# Altium footprint library 7SEG.PCBLIB: 23 footprints (part 2 of 2)
Each footprint in its own frame and in the unit in brackets; x right, y up, seen from the top. Pads: shape width x height; smd on the part's side, far side on the other; paste and mask are expansions set on the pad; w line width, h text height; cw(c..) or ccw(c..) is an arc to the next point about the centre after c.
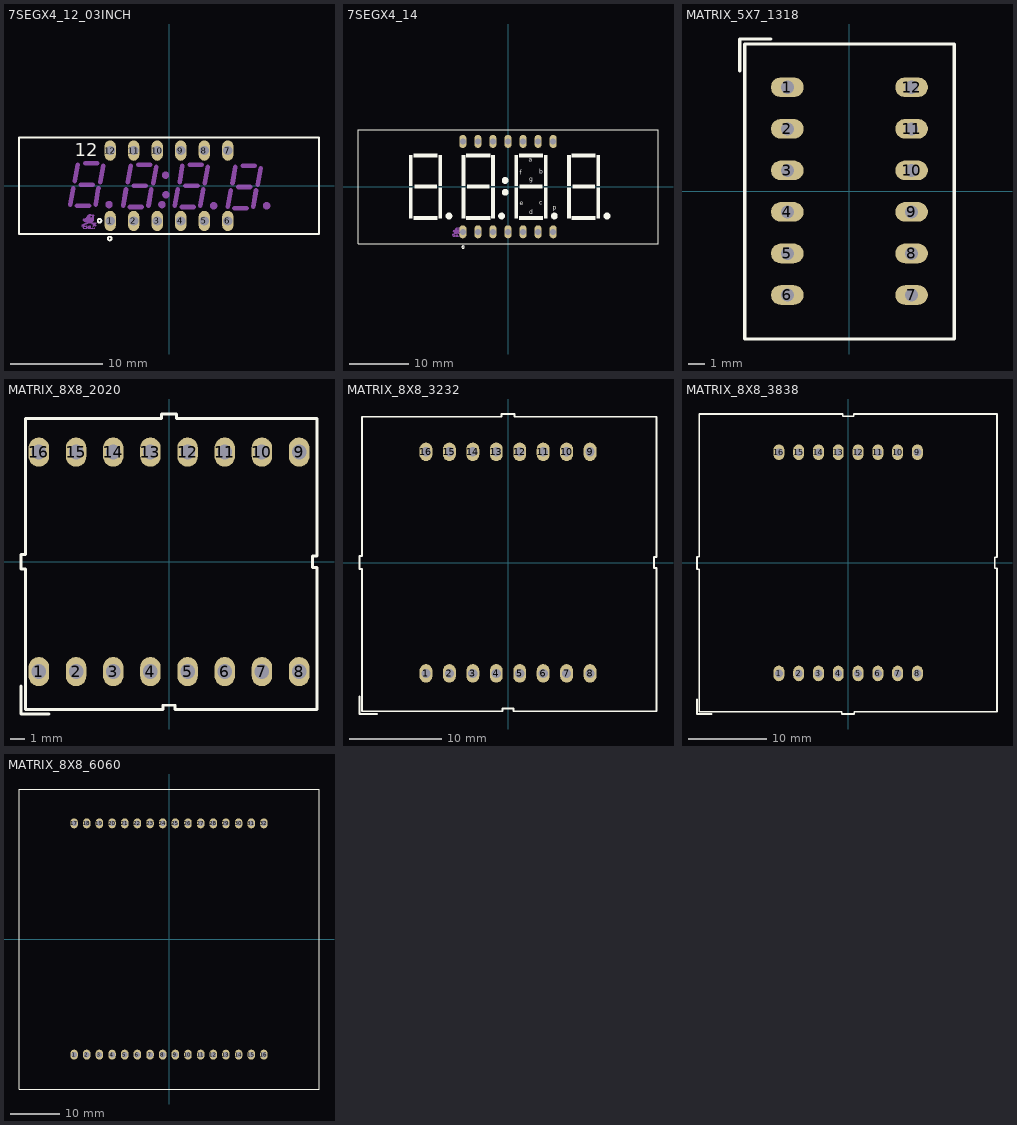
[diagram p1: the footprints below, top view; thin cyan lines are the x and y axes]

## 7SEGX4_12_03INCH [mm] "7SEG 4DIGIT ,0.28\", 12pin Pitch: 2.54mm, 10.2X32mm"
height 5.8
pads (12):
  oval 1.2x2.2 hole 1: 1(-6.35,-3.8) 2(-3.81,-3.8) 3(-1.27,-3.8) 4(1.27,-3.8) 5(3.81,-3.8) 6(6.35,-3.8) 7(6.35,3.8) 8(3.81,3.8) 9(1.27,3.8) 10(-1.27,3.8) 11(-3.81,3.8) 12(-6.35,3.8)
TopOverlay:
  circle w0.2: c-7.5,-3.78 r0.2
  circle w0.2: c-6.4,-5.7 r0.2
  lines w0.2: -16.2,-5.2 16.2,-5.2 16.2,5.2 -16.2,5.2 -16.2,-5.2
  text "12" at -10.16,3.175 h1.4
Mechanical1:
  circle w0.5: c-6.477,-2.032 r0.15
  circle w0.5: c-0.762,-2.032 r0.15
  circle w0.5: c4.826,-2.159 r0.15
  circle w0.5: c10.541,-2.159 r0.15
  circle w0.5: c-0.332,-0.967 r0.15
  circle w0.5: c-0.381,1.143 r0.15
  lines w0.5: -10.668,-2.032 -10.358,-0.259 ; -10.16,0.508 -9.853,2.282 ; -9.942,-2.16 -8.642,-2.16 ; -9.525,0.127 -8.225,0.127 ; -9.047,2.413 -7.747,2.413 ; -7.928,-2.027 -7.62,-0.254 ; -7.428,0.387 -7.112,2.159 ; -4.953,-2.159 -4.643,-0.386 ; -4.445,0.381 -4.138,2.155 ; -4.227,-2.287 -2.927,-2.287 ; -3.81,0 -2.51,0 ; -3.332,2.286 -2.032,2.286 ; -2.213,-2.154 -1.905,-0.381 ; -1.713,0.26 -1.397,2.032 ; 0.635,-2.159 0.945,-0.386 ; 1.143,0.381 1.45,2.155 ; 1.361,-2.287 2.661,-2.287 ; 1.778,0 3.078,0 ; 2.256,2.286 3.556,2.286 ; 3.375,-2.154 3.683,-0.381 ; 3.875,0.26 4.191,2.032 ; 6.35,-2.286 6.66,-0.513 ; 6.858,0.254 7.165,2.028 ; 7.076,-2.414 8.376,-2.414 ; 7.493,-0.127 8.793,-0.127 ; 7.971,2.159 9.271,2.159 ; 9.09,-2.281 9.398,-0.508 ; 9.59,0.133 9.906,1.905
Mechanical16:
  drawing of 8 lines, arcs and shapes, not listed
3D body "User Library-7seg4digit_028.step": height 5.8, standoff -5.7, extent -16,-5.05 16,5.05

## 7SEGX4_14 [mm] "7SEG 4DIGIT, clock 0.56\", 14pin Pitch: 2.54mm, 19X50.3mm"
height 7.62
pads (14):
  oval 1.2x2.2 hole 1: 1(-7.62,-7.62) 2(-5.08,-7.62) 3(-2.54,-7.62) 4(0,-7.62) 5(2.54,-7.62) 6(5.08,-7.62) 7(7.62,-7.62) 8(7.62,7.62) 9(5.08,7.62) 10(2.54,7.62) 11(0,7.62) 12(-2.54,7.62) 13(-5.08,7.62) 14(-7.62,7.62)
TopOverlay:
  circle w0.635: c-0.48,-0.953 r0.254
  circle w0.635: c-0.48,1.047 r0.254
  circle w0.635: c-9.97,-4.953 r0.254
  circle w0.635: c16.7,-4.953 r0.254
  circle w0.635: c-1.08,-4.953 r0.254
  circle w0.635: c7.81,-4.953 r0.254
  circle w0.2: c-7.5,-7.6 r0.2
  circle w0.2: c-7.57,-10.2 r0.2
  rectangle: -15.812,-0.33 -12.002,0.33
  rectangle: -15.939,-5.588 -11.875,-4.953
  rectangle: -15.939,4.953 -11.875,5.588
  rectangle: -11.748,-5.334 -11.113,-0.127
  rectangle: -11.748,0.127 -11.113,5.334
  rectangle: -16.701,0.127 -16.066,5.334
  rectangle: -16.701,-5.334 -16.066,-0.127
  rectangle: 9.969,-5.334 10.604,-0.127
  rectangle: 9.969,0.127 10.604,5.334
  rectangle: 14.922,0.127 15.557,5.334
  rectangle: 14.922,-5.334 15.557,-0.127
  rectangle: 10.731,4.953 14.795,5.588
  rectangle: 10.731,-5.588 14.795,-4.953
  rectangle: 10.858,-0.33 14.668,0.33
  rectangle: -7.811,-5.334 -7.176,-0.127
  rectangle: -7.811,0.127 -7.176,5.334
  rectangle: -2.858,0.127 -2.223,5.334
  rectangle: -2.858,-5.334 -2.223,-0.127
  rectangle: -7.049,4.953 -2.985,5.588
  rectangle: -7.049,-5.588 -2.985,-4.953
  rectangle: 1.968,-0.33 5.778,0.33
  rectangle: 1.841,-5.588 5.905,-4.953
  rectangle: 1.841,4.953 5.905,5.588
  rectangle: 6.032,-5.334 6.667,-0.127
  rectangle: 6.032,0.127 6.667,5.334
  rectangle: 1.079,0.127 1.714,5.334
  rectangle: 1.079,-5.334 1.714,-0.127
  rectangle: -6.922,-0.33 -3.112,0.33
  lines w0.2: -25.3,-9.6 25.3,-9.6 25.3,9.6 -25.3,9.6 -25.3,-9.6
  text "g" at 3.619,0.889 h0.76
  text "p" at 7.556,-3.937 h0.76
  text "b" at 5.27,2.159 h0.76
  text "e" at 1.968,-3.175 h0.76
  text "c" at 5.27,-3.048 h0.76
  text "d" at 3.619,-4.699 h0.76
  text "f" at 1.968,2.032 h0.76
  text "a" at 3.492,4.191 h0.76
Mechanical16:
  drawing of 8 lines, arcs and shapes, not listed
3D body "4digit-7seg-clk.step": height 8.2, standoff -3.9, extent -25.15,-9.5 25.15,9.5

## MATRIX_5X7_1318 [mm] "LED Dot Matrix 5x7 12.7mmx17.8mm"
height 15.7
pads (12):
  oval 2x1.2 hole 0.8: 1(-3.8,6.35) 2(-3.8,3.81) 3(-3.8,1.27) 4(-3.8,-1.27) 5(-3.8,-3.81) 6(-3.8,-6.35) 7(3.8,-6.35) 8(3.8,-3.81) 9(3.8,-1.27) 10(3.8,1.27) 11(3.8,3.81) 12(3.8,6.35)
TopOverlay:
  lines w0.2: -6.7,7.36 -6.7,9.3 -4.8,9.3 ; -6.4,-9.04 6.4,-9.04 6.4,9 -6.4,9 -6.4,-9.04
3D body "User Library-18mm DOTMATRIX DISPLAY.step": height 6.4, standoff -5.5, extent -6.35,-8.89 6.35,8.89

## MATRIX_8X8_2020 [mm] "LED Dot Matrix 8x8 20mmx20mm"
height 15.7
pads (16):
  oval 1.4x2 hole 1: 1(-8.89,-7.5) 2(-6.35,-7.5) 3(-3.81,-7.5) 4(-1.27,-7.5) 5(1.27,-7.5) 6(3.81,-7.5) 7(6.35,-7.5) 8(8.89,-7.5) 9(8.89,7.5) 10(6.35,7.5) 11(3.81,7.5) 12(1.27,7.5) 13(-1.27,7.5) 14(-3.81,7.5) 15(-6.35,7.5) 16(-8.89,7.5)
TopOverlay:
  lines w0.2: -10.1,-8.5 -10.1,-10.4 -8.2,-10.4 ; -10.1,-0.5 -9.8,-0.5 -9.8,-10.1 -0.4,-10.1 -0.4,-9.8 0.4,-9.8 0.4,-10.1 10.1,-10.1 10.1,-0.4 9.8,-0.4 9.8,0.4 10.1,0.4 10.1,9.8 0.5,9.8 0.5,10.1 -0.5,10.1 -0.5,9.8 -9.8,9.8 -9.8,0.5 -10.1,0.5 -10.1,-0.5
3D body: height 5.46, standoff 2, extent -10,-10 10,10

## MATRIX_8X8_3232 [mm] "LED Dot Matrix 8x8 32mmx32mm"
height 15.7
pads (16):
  oval 1.4x2 hole 1: 1(-8.89,-12) 2(-6.35,-12) 3(-3.81,-12) 4(-1.27,-12) 5(1.27,-12) 6(3.81,-12) 7(6.35,-12) 8(8.89,-12) 9(8.89,12) 10(6.35,12) 11(3.81,12) 12(1.27,12) 13(-1.27,12) 14(-3.81,12) 15(-6.35,12) 16(-8.89,12)
TopOverlay:
  lines w0.2: -16.1,-14.5 -16.1,-16.4 -14.2,-16.4 ; -16.1,-0.7 -16.1,0.7 -15.8,0.7 -15.8,15.8 -0.7,15.8 -0.7,16.1 0.7,16.1 0.7,15.8 16.1,15.8 16.1,0.6 15.8,0.6 15.8,-0.6 16.1,-0.6 16.1,-16.1 0.6,-16.1 0.6,-15.8 -0.6,-15.8 -0.6,-16.1 -15.8,-16.1 -15.8,-0.7 -16.1,-0.7
3D body "User Library-Lite-On LTP-12088M.step": height 8, standoff -3.25, extent -15.964,-16 15.964,15.928

## MATRIX_8X8_3838 [mm] "LED Dot Matrix 8x8 38mmx38mm"
height 15.7
pads (16):
  oval 1.4x2 hole 1: 1(-8.89,-14.2) 2(-6.35,-14.2) 3(-3.81,-14.2) 4(-1.27,-14.2) 5(1.27,-14.2) 6(3.81,-14.2) 7(6.35,-14.2) 8(8.89,-14.2) 9(8.89,14.2) 10(6.35,14.2) 11(3.81,14.2) 12(1.27,14.2) 13(-1.27,14.2) 14(-3.81,14.2) 15(-6.35,14.2) 16(-8.89,14.2)
TopOverlay:
  lines w0.2: -19.4,-17.5 -19.4,-19.4 -17.5,-19.4 ; -19.4,-0.8 -19.1,-0.8 -19.1,-19.1 -0.8,-19.1 -0.8,-19.4 0.8,-19.4 0.8,-19.1 19.1,-19.1 19.1,-0.7 18.8,-0.7 18.8,0.7 19.1,0.7 19.1,19.1 0.7,19.1 0.7,18.8 -0.7,18.8 -0.7,19.1 -19.1,19.1 -19.1,0.8 -19.4,0.8 -19.4,-0.8
3D body "User Library-38x38_8x8_LED.step": height 10.4, standoff -4, extent -19.3,-19.3 19,19

## MATRIX_8X8_6060 [mm]
height 1.4
pads (32):
  oval 1.5x2 hole 1.1: 1(-19.05,-23.2) 2(-16.51,-23.2) 3(-13.97,-23.2) 4(-11.43,-23.2) 5(-8.89,-23.2) 6(-6.35,-23.2) 7(-3.81,-23.2) 8(-1.27,-23.2) 9(1.27,-23.2) 10(3.81,-23.2) 11(6.35,-23.2) 12(8.89,-23.2) 13(11.43,-23.2) 14(13.97,-23.2) 15(16.51,-23.2) 16(19.05,-23.2) 17(-19.05,23.2) 18(-16.51,23.2) 19(-13.97,23.2) 20(-11.43,23.2) 21(-8.89,23.2) 22(-6.35,23.2) 23(-3.81,23.2) 24(-1.27,23.2) 25(1.27,23.2) 26(3.81,23.2) 27(6.35,23.2) 28(8.89,23.2) 29(11.43,23.2) 30(13.97,23.2) 31(16.51,23.2) 32(19.05,23.2)
TopOverlay:
  lines w0.2: -30.1,-30.1 -30.1,30.1 30.1,30.1 30.1,-30.1 -30.1,-30.1
  text "." at 12.146,-30.425 h0.89
  text "." at -12.146,-30.425 h0.89
  text "." at -30.425,12.146 h0.89
  text "." at -30.425,-12.146 h0.89
3D body "User Library-Part1-76.STEP": height 7, standoff -4, extent -30,-30 30,30